# Altium footprint library SMT.PcbLib: 379 footprints (part 19 of 24)
Each footprint in its own frame and in the unit in brackets; x right, y up, seen from the top. Pads: shape width x height; smd on the part's side, far side on the other; paste and mask are expansions set on the pad; w line width, h text height; cw(c..) or ccw(c..) is an arc to the next point about the centre after c.
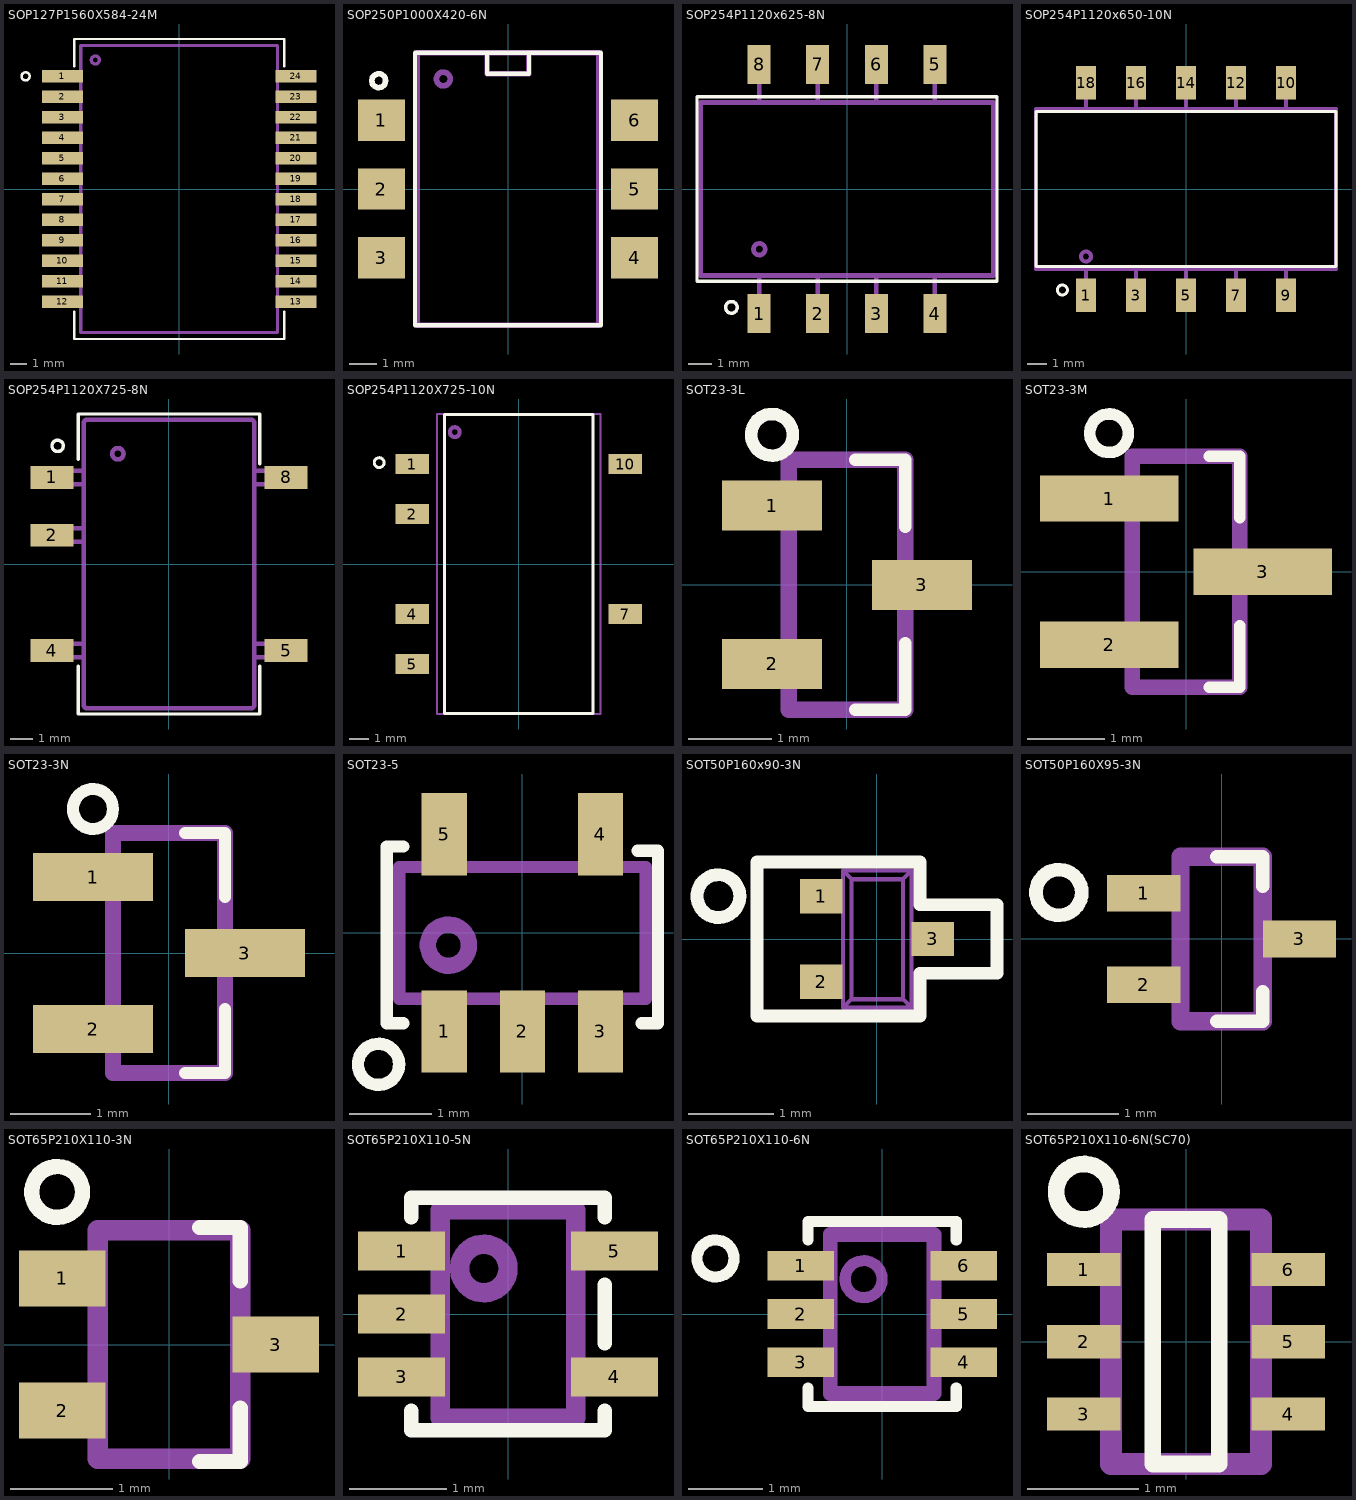
[diagram p18: the footprints below, top view; thin cyan lines are the x and y axes]

## SOP127P1560X584-24M [mm] "SOP, 24-Leads, Body 17,78x12,19mm, Pitch 1,27mm, IPC Low Density"
height 5.84
pads (24):
  rect 2.54x0.76 smd mask+0.05: 1(-7.24,6.985) 2(-7.24,5.715) 3(-7.24,4.445) 4(-7.24,3.175) 5(-7.24,1.905) 6(-7.24,0.635) 7(-7.24,-0.635) 8(-7.24,-1.905) 9(-7.24,-3.175) 10(-7.24,-4.445) 11(-7.24,-5.715) 12(-7.24,-6.985) 13(7.24,-6.985) 14(7.24,-5.715) 15(7.24,-4.445) 16(7.24,-3.175) 17(7.24,-1.905) 18(7.24,-0.635) 19(7.24,0.635) 20(7.24,1.905) 21(7.24,3.175) 22(7.24,4.445) 23(7.24,5.715) 24(7.24,6.985)
Top Overlay:
  circle w0.15: c-9.525,6.985 r0.25
  lines w0.15: -6.5,-7.62 -6.5,-9.3 6.5,-9.3 6.5,-7.62 ; -6.5,7.62 -6.5,9.3 6.5,9.3 6.5,7.62
Mechanical 1:
  circle w0.2: c-5.2,8 r0.25
  lines w0.2: -6.1,-8.9 6.1,-8.9 6.1,8.9 -6.1,8.9 -6.1,-8.9
3D body "SOP127P1560X584-24M.stp": height 5.84, standoff 0, extent -7.78,-8.9 7.78,8.9

## SOP250P1000X420-6N [mm] "SOP, 6-Leads, Body 9,90x6,60mm, Pitch 2,50mm, IPC Medium Density"
height 4.2
pads (6):
  rect 1.7x1.5 smd paste-0.1: 1(-4.6,2.5) 2(-4.6,0) 3(-4.6,-2.5) 4(4.6,-2.5) 5(4.6,0) 6(4.6,2.5)
Top Overlay:
  circle w0.2: c-4.699,3.937 r0.25
  lines w0.15: -0.762,4.95 -0.762,4.191 0.762,4.191 0.762,4.953 ; -3.375,-4.95 3.375,-4.95 3.375,4.95 -3.375,4.95 -3.375,-4.95
Mechanical 1:
  circle w0.2: c-2.35,4 r0.25
  lines w0.2: -0.762,4.95 -0.762,4.191 0.762,4.191 0.762,4.95 ; -3.3,-4.95 3.3,-4.95 3.3,4.95 -3.3,4.95 -3.3,-4.95
3D body "SOP250P1000X420-6N.step": height 4.2, standoff 0, extent -5,-4.95 5,4.95

## SOP254P1120x625-8N [mm] "SOP, 10-Leads, Body 12,7x7.5mm, Pitch 2.54mm, IPC High Density"
height 6.25
pads (8):
  rect 1x1.7 smd: 1(-3.81,-5.4) 2(-1.27,-5.4) 3(1.27,-5.4) 4(3.81,-5.4) 5(3.81,5.4) 6(1.27,5.4) 7(-1.27,5.4) 8(-3.81,5.4)
Top Overlay:
  circle w0.15: c-5.01,-5.131 r0.254
  lines w0.15: -6.5,-4 -6.5,4 6.5,4 6.5,-4 -6.5,-4
Mechanical 1:
  circle w0.2: c-3.8,-2.61 r0.254
  lines w0.2: -3.81,-5.6 -3.81,-3.75 ; -3.81,3.75 -3.81,5.6 ; -1.27,-5.6 -1.27,-3.75 ; -1.27,3.75 -1.27,5.6 ; 1.27,-5.6 1.27,-3.75 ; 1.27,3.75 1.27,5.6 ; 3.81,-5.6 3.81,-3.75 ; 3.81,3.75 3.81,5.6 ; -6.35,-3.75 6.35,-3.75 6.35,3.75 -6.35,3.75 -6.35,-3.75
3D body "User Library-psd-xxxxelf.STEP": height 6.27, standoff 0.02, extent -6.35,-5.6 6.35,5.6

## SOP254P1120x650-10N [mm] "SOP, 10-Leads, Body 15,24x7.4mm, Pitch 2.54mm, IPC High Density"
height 6.5
pads (10):
  rect 1x1.7 smd: 1(-5.08,-5.4) 3(-2.54,-5.4) 5(0,-5.4) 7(2.54,-5.4) 9(5.08,-5.4) 10(5.08,5.4) 12(2.54,5.4) 14(0,5.4) 16(-2.54,5.4) 18(-5.08,5.4)
Top Overlay:
  circle w0.15: c-6.28,-5.131 r0.254
  lines w0.15: -7.62,-3.937 -7.62,3.937 7.62,3.937 7.62,-3.937 -7.62,-3.937
Mechanical 1:
  circle w0.2: c-5.08,-3.429 r0.254
  lines w0.2: -5.08,-5.588 -5.08,-4.064 ; -5.08,4.064 -5.08,5.588 ; -2.54,-5.588 -2.54,-4.064 ; -2.54,4.064 -2.54,5.588 ; 0,-5.588 0,-4.064 ; 0,4.064 0,5.588 ; 2.54,-5.588 2.54,-4.064 ; 2.54,4.064 2.54,5.588 ; 5.08,-5.588 5.08,-4.064 ; 5.08,4.064 5.08,5.588 ; -7.62,-4.064 -7.62,4.064 7.62,4.064 7.62,-4.064 -7.62,-4.064
3D body "DC-DC convector PSD-xxxxZLF Series (Peak electr.).stp": height 6.52, standoff 0.02, extent -7.62,-5.6 7.62,5.6

## SOP254P1120X725-8N [mm] "SOP, 8-Leads, Body 12,7x8,30mm, Pitch 2,54mm, IPC Medium Density"
height 7.25
pads (5):
  rect 1.9x1 smd: 1(-5.15,3.81) 2(-5.15,1.27) 4(-5.15,-3.81) 5(5.15,-3.81) 8(5.15,3.81)
Top Overlay:
  circle w0.15: c-4.9,5.2 r0.25
  lines w0.15: -4,-4.5 -4,-6.6 4,-6.6 4,-4.5 ; -4,4.6 -4,6.6 4,6.6 4,4.4
Mechanical 1:
  circle w0.2: c-2.25,4.85 r0.25
  lines w0.2: -4.55,-4.11 -4.7,-4.11 -5.6,-4.11 -5.6,-3.51 -4.7,-3.51 -4.55,-3.51 ; -4.55,-4.11 -4.55,-3.51 ; -4.55,-4.11 -4.1,-4.11 -3.75,-4.11 ; -4.55,-3.51 -4.1,-3.51 -3.75,-3.51 ; -4.55,0.97 -4.55,1.57 ; -4.55,0.97 -4.1,0.97 -3.75,0.97 ; -4.55,0.97 -4.7,0.97 -5.6,0.97 -5.6,1.57 -4.7,1.57 -4.55,1.57 ; -4.55,1.57 -4.1,1.57 -3.75,1.57 ; -4.55,3.51 -4.55,4.11 ; -4.55,3.51 -4.1,3.51 -3.75,3.51 ; -4.55,3.51 -4.7,3.51 -5.6,3.51 -5.6,4.11 -4.7,4.11 -4.55,4.11 ; -4.55,4.11 -4.1,4.11 -3.75,4.11 ; -3.75,-6.201 ccw(c-3.6,-6.2) -3.601,-6.35 ; -3.75,-6.2 ccw(c-3.6,-6.2) -3.75,-6.201 ; -3.75,-6.2 -3.75,-4.11 ; -3.75,-4.11 -3.75,-3.51 ; -3.75,-3.51 -3.75,0.97 ; -3.75,0.97 -3.75,1.57 ; -3.75,1.57 -3.75,3.51 ; -3.75,3.51 -3.75,4.11 ; -3.75,4.11 -3.75,6.2 ; -3.75,6.201 cw(c-3.6,6.2) -3.601,6.35 ; -3.75,6.201 ccw(c-3.6,6.2) -3.75,6.2 ; -3.601,-6.35 ccw(c-3.6,-6.2) -3.6,-6.35 ; -3.6,-6.35 3.6,-6.35 ; -3.6,6.35 ccw(c-3.6,6.2) -3.601,6.35 ; -3.6,6.35 3.6,6.35 ; 3.601,-6.35 ccw(c3.6,-6.2) 3.75,-6.201 ; 3.6,-6.35 ccw(c3.6,-6.2) 3.601,-6.35 ; 3.601,6.35 ccw(c3.6,6.2) 3.6,6.35 ; 3.601,6.35 cw(c3.6,6.2) 3.75,6.201 ; 3.75,-6.201 ccw(c3.6,-6.2) 3.75,-6.2 ; 3.75,-6.2 3.75,-4.11 ; 3.75,-4.11 4.1,-4.11 4.55,-4.11 ; 3.75,-4.11 3.75,-3.51 ; 3.75,-3.51 4.1,-3.51 4.55,-3.51 ; 3.75,-3.51 3.75,3.51 ; 3.75,3.51 3.75,4.11 ; 3.75,3.51 4.1,3.51 4.55,3.51 ; 3.75,4.11 4.1,4.11 4.55,4.11 ; 3.75,4.11 3.75,6.2 ; 3.75,6.2 ccw(c3.6,6.2) 3.75,6.201 ; 4.55,-4.11 4.7,-4.11 5.6,-4.11 5.6,-3.51 4.7,-3.51 4.55,-3.51 ; 4.55,-4.11 4.55,-3.51 ; 4.55,3.51 4.7,3.51 5.6,3.51 5.6,4.11 4.7,4.11 4.55,4.11 ; 4.55,3.51 4.55,4.11
3D body "PSD1-Series Single output.stp": height 6.26, standoff 0.01, extent -5.6,-6.35 5.6,6.35

## SOP254P1120X725-10N [mm] "SOP, 6-Leads, Body 15,24x8,30mm, Pitch 2,54mm, IPC Medium Density"
height 7.25
pads (6):
  rect 1.7x1 smd: 1(-5.4,5.08) 2(-5.4,2.54) 4(-5.4,-2.54) 5(-5.4,-5.08) 7(5.4,-2.54) 10(5.4,5.08)
Top Overlay:
  circle w0.15: c-7.092,5.15 r0.25
  lines w0.15: -3.775,-7.6 -3.775,7.6 3.775,7.6 3.775,-7.6 -3.775,-7.6
Mechanical 1:
  circle w0.2: c-3.25,6.7 r0.25
  lines w0.1: -4.15,-7.62 -4.15,7.62 4.15,7.62 4.15,-7.62 -4.15,-7.62
3D body "SOP254P1120X725-10N.stp": height 7.25, standoff 0, extent -5.6,-7.6 5.6,7.6

## SOT23-3L [mm] "SOT23, 3-Leads, Body 2.9x1.3mm, Pitch 0.95mm, Lead Span 2.5mm, IPC High Density"
height 1.2
pads (3):
  rect 1.2x0.6 smd: 1(-0.9,0.95) 2(-0.9,-0.95) 3(0.9,0)
Top Overlay:
  circle w0.15: c-0.9,1.8 r0.25
  lines w0.15: 0.1,-1.5 0.7,-1.5 0.7,-0.7 ; 0.1,1.5 0.7,1.5 0.7,0.7
Mechanical 1:
  lines w0.2: -0.7,-1.5 0.7,-1.5 0.7,1.5 -0.7,1.5 -0.7,-1.5
3D body "SOT23.STEP": height 1, standoff 0, extent -1.2,-1.45 1.1,1.45

## SOT23-3M [mm] "SOT23, 3-Leads, Body 2.9x1.3mm, Pitch 0.95mm, Lead Span 2.5mm, IPC Low Density"
height 1.2
pads (3):
  rect 1.8x0.6 smd: 1(-1,0.95) 2(-1,-0.95) 3(1,0)
Top Overlay:
  circle w0.15: c-1,1.8 r0.25
  lines w0.15: 0.3,-1.5 0.7,-1.5 0.7,-0.7 ; 0.3,1.5 0.7,1.5 0.7,0.7
Mechanical 1:
  lines w0.2: -0.7,-1.5 -0.7,1.5 0.7,1.5 0.7,-1.5 -0.7,-1.5
3D body "SOT23.STEP": height 1, standoff 0, extent -1.2,-1.45 1.1,1.45

## SOT23-3N [mm] "SOT23, 3-Leads, Body 2.9x1.3mm, Pitch 0.95mm, Lead Span 2.5mm, IPC Medium Density"
height 1.2
pads (3):
  rect 1.5x0.6 smd: 1(-0.95,0.95) 2(-0.95,-0.95) 3(0.95,0)
Top Overlay:
  circle w0.15: c-0.95,1.8 r0.25
  lines w0.15: 0.2,-1.5 0.7,-1.5 0.7,-0.7 ; 0.2,1.5 0.7,1.5 0.7,0.7
Mechanical 1:
  lines w0.2: -0.7,-1.5 0.7,-1.5 0.7,1.5 -0.7,1.5 -0.7,-1.5
3D body "SOT23.STEP": height 1, standoff 0, extent -1.2,-1.45 1.1,1.45

## SOT23-5 [mm] "5-Lead Small Outline Transistor Package"
height 1.45
pads (5):
  rect 0.55x1 smd: 1(-0.95,-1.2) 2(0,-1.2) 3(0.95,-1.2) 4(0.95,1.2) 5(-0.95,1.2)
Top Overlay:
  circle w0.15: c-1.75,-1.6 r0.25
  lines w0.15: -1.45,-1.1 -1.65,-1.1 -1.65,1.05 -1.45,1.05 ; 1.4,1 1.65,1 1.65,-1.1 1.45,-1.1
Mechanical 1:
  circle w0.2: c-0.9,-0.15 r0.25
  lines w0.15: -0.95,-1.5 -0.95,-0.8 ; -0.95,0.8 -0.95,1.5 ; 0,-1.5 0,-0.8 ; 0.95,-1.5 0.95,-0.8 ; 0.95,0.8 0.95,1.5 ; -1.5,-0.8 -1.5,0.8 1.5,0.8 1.5,-0.8 -1.5,-0.8
3D body "SOT-23-5.step": height 1.11, standoff 0.01, extent -1.5,-1.25 1.5,1.25

## SOT50P160x90-3N [mm] "SOT523, 3-Leads, Body 1.6x0.9mm, Pitch 1.0mm, IPC Medium Density"
height 0.9
pads (3):
  rect 0.5x0.4 smd: 1(-0.65,0.5) 2(-0.65,-0.5) 3(0.65,0)
Top Overlay:
  circle w0.15: c-1.85,0.5 r0.25
  lines w0.15: -1.4,-0.9 -1.4,0.9 0.5,0.9 0.5,0.4 1.4,0.4 1.4,-0.4 0.5,-0.4 0.5,-0.9 -1.4,-0.9
Mechanical 1:
  lines w0.05: -0.398,-0.801 0.402,-0.801 ; -0.398,-0.801 -0.298,-0.701 ; -0.398,-0.801 -0.398,-0.601 ; -0.398,-0.601 -0.423,-0.601 -0.438,-0.601 -0.542,-0.601 -0.798,-0.601 -0.798,-0.401 -0.542,-0.401 -0.438,-0.401 -0.423,-0.401 -0.398,-0.401 ; -0.398,-0.601 -0.398,-0.401 ; -0.398,-0.401 -0.398,0.399 ; -0.398,0.399 -0.423,0.399 -0.438,0.399 -0.542,0.399 -0.798,0.399 -0.798,0.599 -0.542,0.599 -0.438,0.599 -0.423,0.599 -0.398,0.599 ; -0.398,0.399 -0.398,0.599 ; -0.398,0.599 -0.398,0.799 ; -0.398,0.799 -0.298,0.699 ; -0.398,0.799 0.402,0.799 ; -0.298,-0.701 -0.298,0.699 ; -0.298,-0.701 0.302,-0.701 ; -0.298,0.699 0.302,0.699 ; 0.302,-0.701 0.402,-0.801 ; 0.302,-0.701 0.302,0.699 ; 0.302,0.699 0.402,0.799 ; 0.402,-0.801 0.402,-0.145 ; 0.402,-0.145 0.402,0.142 ; 0.402,-0.145 0.427,-0.145 0.442,-0.145 0.547,-0.145 0.802,-0.145 0.802,0.142 0.547,0.142 0.442,0.142 0.427,0.142 0.402,0.142 ; 0.402,0.142 0.402,0.799
3D body "User Library-SOT-523.STEP": height 0.8, standoff 0, extent -0.8,-0.8 0.8,0.8

## SOT50P160X95-3N [mm] "SOT23, 3-Leads, Body 1,60x1,60mm, Pitch 0,50mm, IPC Medium Density"
height 0.95
pads (3):
  rect 0.8x0.4 smd: 1(-0.85,0.5) 2(-0.85,-0.5) 3(0.85,0)
Top Overlay:
  circle w0.15: c-1.778,0.508 r0.25
  lines w0.15: -0.05,-0.9 0.45,-0.9 0.45,-0.575 ; -0.05,0.9 0.45,0.9 0.45,0.575
Mechanical 1:
  lines w0.15: -0.889,0.508 -0.45,0.508 ; -0.875,-0.508 -0.45,-0.508 ; 0.45,0 0.875,0
  lines w0.2: -0.45,-0.9 -0.45,0.9 0.45,0.9 0.45,-0.9 -0.45,-0.9
3D body "User Library-SOT-416.STEP": height 0.8, standoff 0, extent -0.8,-0.8 0.8,0.8

## SOT65P210X110-3N [mm] "SOT23, 3-Leads, Body 2,0x2,10mm, Pitch 0,65mm, IPC Medium Density"
height 1.1
pads (3):
  rect 0.85x0.55 smd: 1(-1.05,0.65) 2(-1.05,-0.65) 3(1.05,0)
Top Overlay:
  circle w0.15: c-1.1,1.5 r0.25
  lines w0.15: 0.3,-1.15 0.7,-1.15 0.7,-0.625 ; 0.3,1.15 0.7,1.15 0.7,0.625
Mechanical 1:
  lines w0.2: -0.7,-1.125 -0.7,1.125 0.7,1.125 0.7,-1.125 -0.7,-1.125
3D body "User Library-SOT323 (SC70-3)-1.STEP": height 1.11, standoff 0.01, extent -1.1,-1.1 1.145,1.1

## SOT65P210X110-5N [mm] "SOT353, 5-Leads, Body 1,25x2,00mmx1.10 (max), Pitch 0,65mm, IPC Medium Density"
height 1.1
pads (5):
  rect 0.9x0.4 smd mask+0.06: 1(-1.1,0.65) 2(-1.1,0) 3(-1.1,-0.65) 4(1.1,-0.65) 5(1.1,0.65)
Top Overlay:
  lines w0.15: -1,-1 -1,-1.2 1,-1.2 1,-1 ; -1,1 -1,1.2 1,1.2 1,1 ; 1,-0.3 1,0.3
Mechanical 1:
  circle w0.2: c-0.25,0.47 r0.25
  lines w0.2: -0.7,-1.075 0.7,-1.075 0.7,1.075 -0.7,1.075 -0.7,-1.075
3D body "SOT353.STEP": height 0.97, standoff 0.02, extent -1.05,-1 1.05,1

## SOT65P210X110-6N [mm] "SOT363, 6-Leads, Body 1,25x2,00mmx1.10 (max), Pitch 0,65mm, IPC Medium Density"
height 1.1
pads (6):
  rect 0.9x0.4 smd paste-0.05 mask+0.05: 1(-1.1,0.65) 2(-1.1,0) 3(-1.1,-0.65) 4(1.1,-0.65) 5(1.1,0) 6(1.1,0.65)
Top Overlay:
  circle w0.15: c-2.25,0.75 r0.25
  lines w0.15: -1,-1 -1,-1.25 1,-1.25 1,-1 ; -1,1 -1,1.25 0.75,1.25 1,1.25 1,1
Mechanical 1:
  circle w0.15: c-0.25,0.47 r0.25
  lines w0.2: -0.7,-1.075 0.7,-1.075 0.7,1.075 -0.7,1.075 -0.7,-1.075
3D body "SW3dPS-SW3dPS-SOT363.STEP": height 1.01, standoff 0.02, extent -1.05,-1 1.05,1

## SOT65P210X110-6N(SC70) [mm] "SOT23, 6-Leads, Body 2,00x2,10mm, Pitch 0,65mm, IPC Medium Density"
height 1.1
pads (6):
  rect 0.66x0.3 smd: 1(-0.92,0.65) 2(-0.92,0) 3(-0.92,-0.65) 4(0.92,-0.65) 5(0.92,0) 6(0.92,0.65)
Top Overlay:
  circle w0.15: c-0.92,1.35 r0.25
  lines w0.15: -0.3,-1.1 -0.3,1.1 0.3,1.1 0.3,-1.1 -0.3,-1.1
Mechanical 1:
  lines w0.2: -0.675,-1.1 0.675,-1.1 0.675,1.1 -0.675,1.1 -0.675,-1.1
3D body "SOT65P210X110-6N.step": height 1.1, standoff 0, extent -1.1,-1.1 1.1,1.1